# Altium footprint library ST封装.PcbLib: 1336 footprints (part 79 of 109)
Each footprint in its own frame and in the unit in brackets; x right, y up, seen from the top. Pads: shape width x height; smd on the part's side, far side on the other; paste and mask are expansions set on the pad; w line width, h text height; cw(c..) or ccw(c..) is an arc to the next point about the centre after c.
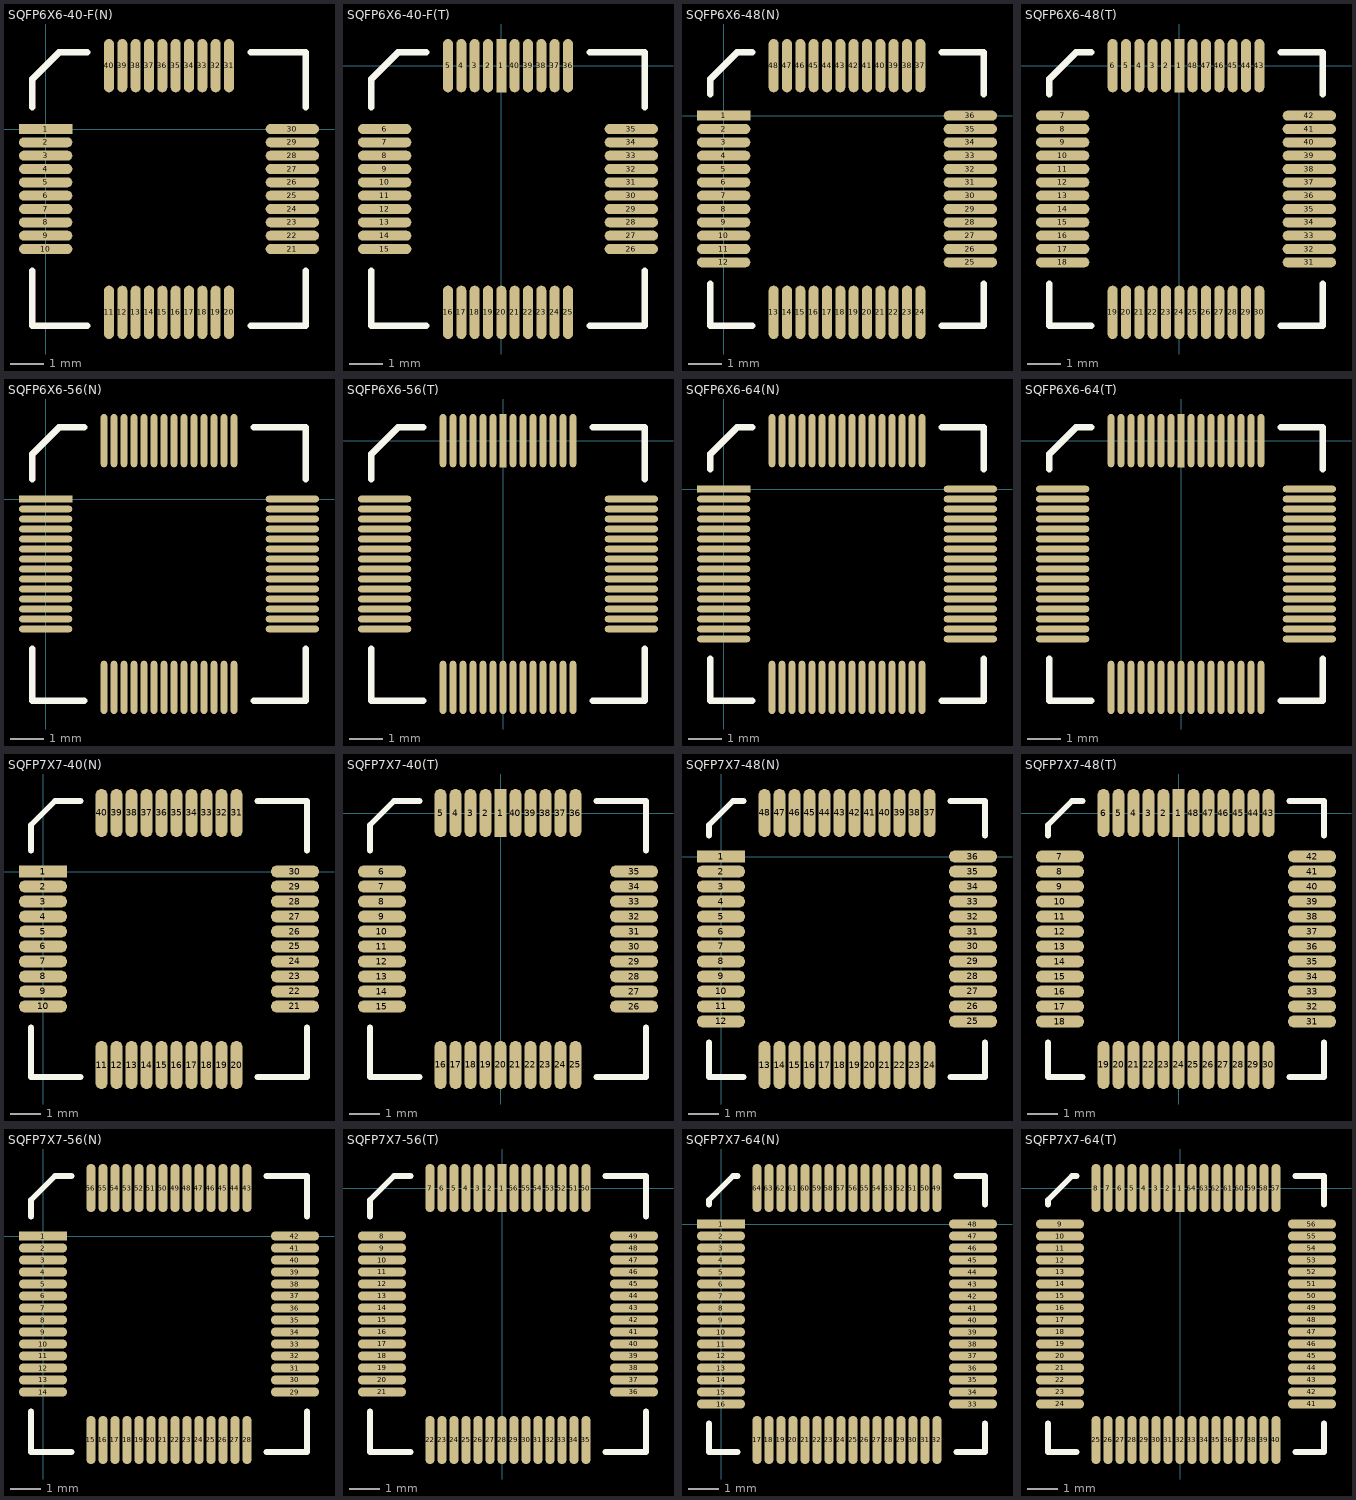
[diagram p78: the footprints below, top view; thin cyan lines are the x and y axes]

## SQFP6X6-40-F(N) [mm]
pads (40):
  rect 1.6x0.3 smd: 1(0,0)
  oval 1.6x0.3 smd: 2(0,-0.4) 3(0,-0.8) 4(0,-1.2) 5(0,-1.6) 6(0,-2) 7(0,-2.4) 8(0,-2.8) 9(0,-3.2) 10(0,-3.6) 21(7.4,-3.6) 22(7.4,-3.2) 23(7.4,-2.8) 24(7.4,-2.4) 25(7.4,-2) 26(7.4,-1.6) 27(7.4,-1.2) 28(7.4,-0.8) 29(7.4,-0.4) 30(7.4,0)
  oval 0.3x1.6 smd: 11(1.9,-5.5) 12(2.3,-5.5) 13(2.7,-5.5) 14(3.1,-5.5) 15(3.5,-5.5) 16(3.9,-5.5) 17(4.3,-5.5) 18(4.7,-5.5) 19(5.1,-5.5) 20(5.5,-5.5) 31(5.5,1.9) 32(5.1,1.9) 33(4.7,1.9) 34(4.3,1.9) 35(3.9,1.9) 36(3.5,1.9) 37(3.1,1.9) 38(2.7,1.9) 39(2.3,1.9) 40(1.9,1.9)
Top Overlay:
  lines w0.2: -0.4,-4.25 -0.4,-5.9 1.25,-5.9 ; -0.4,0.65 -0.4,1.5 0.4,2.3 1.25,2.3 ; 6.15,-5.9 7.8,-5.9 7.8,-4.25 ; 6.15,2.3 7.8,2.3 7.8,0.65

## SQFP6X6-40-F(T) [mm]
pads (40):
  rect 0.3x1.6 smd: 1(0,0)
  oval 0.3x1.6 smd: 2(-0.4,0) 3(-0.8,0) 4(-1.2,0) 5(-1.6,0) 16(-1.6,-7.4) 17(-1.2,-7.4) 18(-0.8,-7.4) 19(-0.4,-7.4) 20(0,-7.4) 21(0.4,-7.4) 22(0.8,-7.4) 23(1.2,-7.4) 24(1.6,-7.4) 25(2,-7.4) 36(2,0) 37(1.6,0) 38(1.2,0) 39(0.8,0) 40(0.4,0)
  oval 1.6x0.3 smd: 6(-3.5,-1.9) 7(-3.5,-2.3) 8(-3.5,-2.7) 9(-3.5,-3.1) 10(-3.5,-3.5) 11(-3.5,-3.9) 12(-3.5,-4.3) 13(-3.5,-4.7) 14(-3.5,-5.1) 15(-3.5,-5.5) 26(3.9,-5.5) 27(3.9,-5.1) 28(3.9,-4.7) 29(3.9,-4.3) 30(3.9,-3.9) 31(3.9,-3.5) 32(3.9,-3.1) 33(3.9,-2.7) 34(3.9,-2.3) 35(3.9,-1.9)
Top Overlay:
  lines w0.2: -3.9,-6.15 -3.9,-7.8 -2.25,-7.8 ; -3.9,-1.25 -3.9,-0.4 -3.1,0.4 -2.25,0.4 ; 2.65,-7.8 4.3,-7.8 4.3,-6.15 ; 2.65,0.4 4.3,0.4 4.3,-1.25

## SQFP6X6-48(N) [mm]
pads (48):
  rect 1.6x0.3 smd: 1(0,0)
  oval 1.6x0.3 smd: 2(0,-0.4) 3(0,-0.8) 4(0,-1.2) 5(0,-1.6) 6(0,-2) 7(0,-2.4) 8(0,-2.8) 9(0,-3.2) 10(0,-3.6) 11(0,-4) 12(0,-4.4) 25(7.4,-4.4) 26(7.4,-4) 27(7.4,-3.6) 28(7.4,-3.2) 29(7.4,-2.8) 30(7.4,-2.4) 31(7.4,-2) 32(7.4,-1.6) 33(7.4,-1.2) 34(7.4,-0.8) 35(7.4,-0.4) 36(7.4,0)
  oval 0.3x1.6 smd: 13(1.5,-5.9) 14(1.9,-5.9) 15(2.3,-5.9) 16(2.7,-5.9) 17(3.1,-5.9) 18(3.5,-5.9) 19(3.9,-5.9) 20(4.3,-5.9) 21(4.7,-5.9) 22(5.1,-5.9) 23(5.5,-5.9) 24(5.9,-5.9) 37(5.9,1.5) 38(5.5,1.5) 39(5.1,1.5) 40(4.7,1.5) 41(4.3,1.5) 42(3.9,1.5) 43(3.5,1.5) 44(3.1,1.5) 45(2.7,1.5) 46(2.3,1.5) 47(1.9,1.5) 48(1.5,1.5)
Top Overlay:
  lines w0.2: -0.4,-5.05 -0.4,-6.3 0.85,-6.3 ; -0.4,0.65 -0.4,1.1 0.4,1.9 0.85,1.9 ; 6.55,-6.3 7.8,-6.3 7.8,-5.05 ; 6.55,1.9 7.8,1.9 7.8,0.65

## SQFP6X6-48(T) [mm]
pads (48):
  rect 0.3x1.6 smd: 1(0,0)
  oval 0.3x1.6 smd: 2(-0.4,0) 3(-0.8,0) 4(-1.2,0) 5(-1.6,0) 6(-2,0) 19(-2,-7.4) 20(-1.6,-7.4) 21(-1.2,-7.4) 22(-0.8,-7.4) 23(-0.4,-7.4) 24(0,-7.4) 25(0.4,-7.4) 26(0.8,-7.4) 27(1.2,-7.4) 28(1.6,-7.4) 29(2,-7.4) 30(2.4,-7.4) 43(2.4,0) 44(2,0) 45(1.6,0) 46(1.2,0) 47(0.8,0) 48(0.4,0)
  oval 1.6x0.3 smd: 7(-3.5,-1.5) 8(-3.5,-1.9) 9(-3.5,-2.3) 10(-3.5,-2.7) 11(-3.5,-3.1) 12(-3.5,-3.5) 13(-3.5,-3.9) 14(-3.5,-4.3) 15(-3.5,-4.7) 16(-3.5,-5.1) 17(-3.5,-5.5) 18(-3.5,-5.9) 31(3.9,-5.9) 32(3.9,-5.5) 33(3.9,-5.1) 34(3.9,-4.7) 35(3.9,-4.3) 36(3.9,-3.9) 37(3.9,-3.5) 38(3.9,-3.1) 39(3.9,-2.7) 40(3.9,-2.3) 41(3.9,-1.9) 42(3.9,-1.5)
Top Overlay:
  lines w0.2: -3.9,-6.55 -3.9,-7.8 -2.65,-7.8 ; -3.9,-0.85 -3.9,-0.4 -3.1,0.4 -2.65,0.4 ; 3.05,-7.8 4.3,-7.8 4.3,-6.55 ; 3.05,0.4 4.3,0.4 4.3,-0.85

## SQFP6X6-56(N) [mm]
pads (56):
  rect 1.6x0.2 smd: 1(0,0)
  oval 1.6x0.2 smd: 2(0,-0.3) 3(0,-0.6) 4(0,-0.9) 5(0,-1.2) 6(0,-1.5) 7(0,-1.8) 8(0,-2.1) 9(0,-2.4) 10(0,-2.7) 11(0,-3) 12(0,-3.3) 13(0,-3.6) 14(0,-3.9) 29(7.4,-3.9) 30(7.4,-3.6) 31(7.4,-3.3) 32(7.4,-3) 33(7.4,-2.7) 34(7.4,-2.4) 35(7.4,-2.1) 36(7.4,-1.8) 37(7.4,-1.5) 38(7.4,-1.2) 39(7.4,-0.9) 40(7.4,-0.6) 41(7.4,-0.3) 42(7.4,0)
  oval 0.2x1.6 smd: 15(1.75,-5.65) 16(2.05,-5.65) 17(2.35,-5.65) 18(2.65,-5.65) 19(2.95,-5.65) 20(3.25,-5.65) 21(3.55,-5.65) 22(3.85,-5.65) 23(4.15,-5.65) 24(4.45,-5.65) 25(4.75,-5.65) 26(5.05,-5.65) 27(5.35,-5.65) 28(5.65,-5.65) 43(5.65,1.75) 44(5.35,1.75) 45(5.05,1.75) 46(4.75,1.75) 47(4.45,1.75) 48(4.15,1.75) 49(3.85,1.75) 50(3.55,1.75) 51(3.25,1.75) 52(2.95,1.75) 53(2.65,1.75) 54(2.35,1.75) 55(2.05,1.75) 56(1.75,1.75)
Top Overlay:
  lines w0.2: -0.4,-4.5 -0.4,-6.05 1.15,-6.05 ; -0.4,0.6 -0.4,1.35 0.4,2.15 1.15,2.15 ; 6.25,-6.05 7.8,-6.05 7.8,-4.5 ; 6.25,2.15 7.8,2.15 7.8,0.6

## SQFP6X6-56(T) [mm]
pads (56):
  rect 0.2x1.6 smd: 1(0,0)
  oval 0.2x1.6 smd: 2(-0.3,0) 3(-0.6,0) 4(-0.9,0) 5(-1.2,0) 6(-1.5,0) 7(-1.8,0) 22(-1.8,-7.4) 23(-1.5,-7.4) 24(-1.2,-7.4) 25(-0.9,-7.4) 26(-0.6,-7.4) 27(-0.3,-7.4) 28(0,-7.4) 29(0.3,-7.4) 30(0.6,-7.4) 31(0.9,-7.4) 32(1.2,-7.4) 33(1.5,-7.4) 34(1.8,-7.4) 35(2.1,-7.4) 50(2.1,0) 51(1.8,0) 52(1.5,0) 53(1.2,0) 54(0.9,0) 55(0.6,0) 56(0.3,0)
  oval 1.6x0.2 smd: 8(-3.55,-1.75) 9(-3.55,-2.05) 10(-3.55,-2.35) 11(-3.55,-2.65) 12(-3.55,-2.95) 13(-3.55,-3.25) 14(-3.55,-3.55) 15(-3.55,-3.85) 16(-3.55,-4.15) 17(-3.55,-4.45) 18(-3.55,-4.75) 19(-3.55,-5.05) 20(-3.55,-5.35) 21(-3.55,-5.65) 36(3.85,-5.65) 37(3.85,-5.35) 38(3.85,-5.05) 39(3.85,-4.75) 40(3.85,-4.45) 41(3.85,-4.15) 42(3.85,-3.85) 43(3.85,-3.55) 44(3.85,-3.25) 45(3.85,-2.95) 46(3.85,-2.65) 47(3.85,-2.35) 48(3.85,-2.05) 49(3.85,-1.75)
Top Overlay:
  lines w0.2: -3.95,-6.25 -3.95,-7.8 -2.4,-7.8 ; -3.95,-1.15 -3.95,-0.4 -3.15,0.4 -2.4,0.4 ; 2.7,-7.8 4.25,-7.8 4.25,-6.25 ; 2.7,0.4 4.25,0.4 4.25,-1.15

## SQFP6X6-64(N) [mm]
pads (64):
  rect 1.6x0.2 smd: 1(0,0)
  oval 1.6x0.2 smd: 2(0,-0.3) 3(0,-0.6) 4(0,-0.9) 5(0,-1.2) 6(0,-1.5) 7(0,-1.8) 8(0,-2.1) 9(0,-2.4) 10(0,-2.7) 11(0,-3) 12(0,-3.3) 13(0,-3.6) 14(0,-3.9) 15(0,-4.2) 16(0,-4.5) 33(7.4,-4.5) 34(7.4,-4.2) 35(7.4,-3.9) 36(7.4,-3.6) 37(7.4,-3.3) 38(7.4,-3) 39(7.4,-2.7) 40(7.4,-2.4) 41(7.4,-2.1) 42(7.4,-1.8) 43(7.4,-1.5) 44(7.4,-1.2) 45(7.4,-0.9) 46(7.4,-0.6) 47(7.4,-0.3) 48(7.4,0)
  oval 0.2x1.6 smd: 17(1.45,-5.95) 18(1.75,-5.95) 19(2.05,-5.95) 20(2.35,-5.95) 21(2.65,-5.95) 22(2.95,-5.95) 23(3.25,-5.95) 24(3.55,-5.95) 25(3.85,-5.95) 26(4.15,-5.95) 27(4.45,-5.95) 28(4.75,-5.95) 29(5.05,-5.95) 30(5.35,-5.95) 31(5.65,-5.95) 32(5.95,-5.95) 49(5.95,1.45) 50(5.65,1.45) 51(5.35,1.45) 52(5.05,1.45) 53(4.75,1.45) 54(4.45,1.45) 55(4.15,1.45) 56(3.85,1.45) 57(3.55,1.45) 58(3.25,1.45) 59(2.95,1.45) 60(2.65,1.45) 61(2.35,1.45) 62(2.05,1.45) 63(1.75,1.45) 64(1.45,1.45)
Top Overlay:
  lines w0.2: -0.4,-5.1 -0.4,-6.35 0.85,-6.35 ; -0.4,0.6 -0.4,1.05 0.4,1.85 0.85,1.85 ; 6.55,-6.35 7.8,-6.35 7.8,-5.1 ; 6.55,1.85 7.8,1.85 7.8,0.6

## SQFP6X6-64(T) [mm]
pads (64):
  rect 0.2x1.6 smd: 1(0,0)
  oval 0.2x1.6 smd: 2(-0.3,0) 3(-0.6,0) 4(-0.9,0) 5(-1.2,0) 6(-1.5,0) 7(-1.8,0) 8(-2.1,0) 25(-2.1,-7.4) 26(-1.8,-7.4) 27(-1.5,-7.4) 28(-1.2,-7.4) 29(-0.9,-7.4) 30(-0.6,-7.4) 31(-0.3,-7.4) 32(0,-7.4) 33(0.3,-7.4) 34(0.6,-7.4) 35(0.9,-7.4) 36(1.2,-7.4) 37(1.5,-7.4) 38(1.8,-7.4) 39(2.1,-7.4) 40(2.4,-7.4) 57(2.4,0) 58(2.1,0) 59(1.8,0) 60(1.5,0) 61(1.2,0) 62(0.9,0) 63(0.6,0) 64(0.3,0)
  oval 1.6x0.2 smd: 9(-3.55,-1.45) 10(-3.55,-1.75) 11(-3.55,-2.05) 12(-3.55,-2.35) 13(-3.55,-2.65) 14(-3.55,-2.95) 15(-3.55,-3.25) 16(-3.55,-3.55) 17(-3.55,-3.85) 18(-3.55,-4.15) 19(-3.55,-4.45) 20(-3.55,-4.75) 21(-3.55,-5.05) 22(-3.55,-5.35) 23(-3.55,-5.65) 24(-3.55,-5.95) 41(3.85,-5.95) 42(3.85,-5.65) 43(3.85,-5.35) 44(3.85,-5.05) 45(3.85,-4.75) 46(3.85,-4.45) 47(3.85,-4.15) 48(3.85,-3.85) 49(3.85,-3.55) 50(3.85,-3.25) 51(3.85,-2.95) 52(3.85,-2.65) 53(3.85,-2.35) 54(3.85,-2.05) 55(3.85,-1.75) 56(3.85,-1.45)
Top Overlay:
  lines w0.2: -3.95,-6.55 -3.95,-7.8 -2.7,-7.8 ; -3.95,-0.85 -3.95,-0.4 -3.15,0.4 -2.7,0.4 ; 3,-7.8 4.25,-7.8 4.25,-6.55 ; 3,0.4 4.25,0.4 4.25,-0.85

## SQFP7X7-40(N) [mm]
pads (40):
  rect 1.6x0.4 smd: 1(0,0)
  oval 1.6x0.4 smd: 2(0,-0.5) 3(0,-1) 4(0,-1.5) 5(0,-2) 6(0,-2.5) 7(0,-3) 8(0,-3.5) 9(0,-4) 10(0,-4.5) 21(8.4,-4.5) 22(8.4,-4) 23(8.4,-3.5) 24(8.4,-3) 25(8.4,-2.5) 26(8.4,-2) 27(8.4,-1.5) 28(8.4,-1) 29(8.4,-0.5) 30(8.4,0)
  oval 0.4x1.6 smd: 11(1.95,-6.45) 12(2.45,-6.45) 13(2.95,-6.45) 14(3.45,-6.45) 15(3.95,-6.45) 16(4.45,-6.45) 17(4.95,-6.45) 18(5.45,-6.45) 19(5.95,-6.45) 20(6.45,-6.45) 31(6.45,1.95) 32(5.95,1.95) 33(5.45,1.95) 34(4.95,1.95) 35(4.45,1.95) 36(3.95,1.95) 37(3.45,1.95) 38(2.95,1.95) 39(2.45,1.95) 40(1.95,1.95)
Top Overlay:
  lines w0.2: -0.4,-5.2 -0.4,-6.85 1.25,-6.85 ; -0.4,0.7 -0.4,1.55 0.4,2.35 1.25,2.35 ; 7.15,-6.85 8.8,-6.85 8.8,-5.2 ; 7.15,2.35 8.8,2.35 8.8,0.7

## SQFP7X7-40(T) [mm]
pads (40):
  rect 0.4x1.6 smd: 1(0,0)
  oval 0.4x1.6 smd: 2(-0.5,0) 3(-1,0) 4(-1.5,0) 5(-2,0) 16(-2,-8.4) 17(-1.5,-8.4) 18(-1,-8.4) 19(-0.5,-8.4) 20(0,-8.4) 21(0.5,-8.4) 22(1,-8.4) 23(1.5,-8.4) 24(2,-8.4) 25(2.5,-8.4) 36(2.5,0) 37(2,0) 38(1.5,0) 39(1,0) 40(0.5,0)
  oval 1.6x0.4 smd: 6(-3.95,-1.95) 7(-3.95,-2.45) 8(-3.95,-2.95) 9(-3.95,-3.45) 10(-3.95,-3.95) 11(-3.95,-4.45) 12(-3.95,-4.95) 13(-3.95,-5.45) 14(-3.95,-5.95) 15(-3.95,-6.45) 26(4.45,-6.45) 27(4.45,-5.95) 28(4.45,-5.45) 29(4.45,-4.95) 30(4.45,-4.45) 31(4.45,-3.95) 32(4.45,-3.45) 33(4.45,-2.95) 34(4.45,-2.45) 35(4.45,-1.95)
Top Overlay:
  lines w0.2: -4.35,-7.15 -4.35,-8.8 -2.7,-8.8 ; -4.35,-1.25 -4.35,-0.4 -3.55,0.4 -2.7,0.4 ; 3.2,-8.8 4.85,-8.8 4.85,-7.15 ; 3.2,0.4 4.85,0.4 4.85,-1.25

## SQFP7X7-48(N) [mm]
pads (48):
  rect 1.6x0.4 smd: 1(0,0)
  oval 1.6x0.4 smd: 2(0,-0.5) 3(0,-1) 4(0,-1.5) 5(0,-2) 6(0,-2.5) 7(0,-3) 8(0,-3.5) 9(0,-4) 10(0,-4.5) 11(0,-5) 12(0,-5.5) 25(8.4,-5.5) 26(8.4,-5) 27(8.4,-4.5) 28(8.4,-4) 29(8.4,-3.5) 30(8.4,-3) 31(8.4,-2.5) 32(8.4,-2) 33(8.4,-1.5) 34(8.4,-1) 35(8.4,-0.5) 36(8.4,0)
  oval 0.4x1.6 smd: 13(1.45,-6.95) 14(1.95,-6.95) 15(2.45,-6.95) 16(2.95,-6.95) 17(3.45,-6.95) 18(3.95,-6.95) 19(4.45,-6.95) 20(4.95,-6.95) 21(5.45,-6.95) 22(5.95,-6.95) 23(6.45,-6.95) 24(6.95,-6.95) 37(6.95,1.45) 38(6.45,1.45) 39(5.95,1.45) 40(5.45,1.45) 41(4.95,1.45) 42(4.45,1.45) 43(3.95,1.45) 44(3.45,1.45) 45(2.95,1.45) 46(2.45,1.45) 47(1.95,1.45) 48(1.45,1.45)
Top Overlay:
  lines w0.2: -0.4,-6.2 -0.4,-7.35 0.75,-7.35 ; -0.4,0.7 -0.4,1.05 0.4,1.85 0.75,1.85 ; 7.65,-7.35 8.8,-7.35 8.8,-6.2 ; 7.65,1.85 8.8,1.85 8.8,0.7

## SQFP7X7-48(T) [mm]
pads (48):
  rect 0.4x1.6 smd: 1(0,0)
  oval 0.4x1.6 smd: 2(-0.5,0) 3(-1,0) 4(-1.5,0) 5(-2,0) 6(-2.5,0) 19(-2.5,-8.4) 20(-2,-8.4) 21(-1.5,-8.4) 22(-1,-8.4) 23(-0.5,-8.4) 24(0,-8.4) 25(0.5,-8.4) 26(1,-8.4) 27(1.5,-8.4) 28(2,-8.4) 29(2.5,-8.4) 30(3,-8.4) 43(3,0) 44(2.5,0) 45(2,0) 46(1.5,0) 47(1,0) 48(0.5,0)
  oval 1.6x0.4 smd: 7(-3.95,-1.45) 8(-3.95,-1.95) 9(-3.95,-2.45) 10(-3.95,-2.95) 11(-3.95,-3.45) 12(-3.95,-3.95) 13(-3.95,-4.45) 14(-3.95,-4.95) 15(-3.95,-5.45) 16(-3.95,-5.95) 17(-3.95,-6.45) 18(-3.95,-6.95) 31(4.45,-6.95) 32(4.45,-6.45) 33(4.45,-5.95) 34(4.45,-5.45) 35(4.45,-4.95) 36(4.45,-4.45) 37(4.45,-3.95) 38(4.45,-3.45) 39(4.45,-2.95) 40(4.45,-2.45) 41(4.45,-1.95) 42(4.45,-1.45)
Top Overlay:
  lines w0.2: -4.35,-7.65 -4.35,-8.8 -3.2,-8.8 ; -4.35,-0.75 -4.35,-0.4 -3.55,0.4 -3.2,0.4 ; 3.7,-8.8 4.85,-8.8 4.85,-7.65 ; 3.7,0.4 4.85,0.4 4.85,-0.75

## SQFP7X7-56(N) [mm]
pads (56):
  rect 1.6x0.3 smd: 1(0,0)
  oval 1.6x0.3 smd: 2(0,-0.4) 3(0,-0.8) 4(0,-1.2) 5(0,-1.6) 6(0,-2) 7(0,-2.4) 8(0,-2.8) 9(0,-3.2) 10(0,-3.6) 11(0,-4) 12(0,-4.4) 13(0,-4.8) 14(0,-5.2) 29(8.4,-5.2) 30(8.4,-4.8) 31(8.4,-4.4) 32(8.4,-4) 33(8.4,-3.6) 34(8.4,-3.2) 35(8.4,-2.8) 36(8.4,-2.4) 37(8.4,-2) 38(8.4,-1.6) 39(8.4,-1.2) 40(8.4,-0.8) 41(8.4,-0.4) 42(8.4,0)
  oval 0.3x1.6 smd: 15(1.6,-6.8) 16(2,-6.8) 17(2.4,-6.8) 18(2.8,-6.8) 19(3.2,-6.8) 20(3.6,-6.8) 21(4,-6.8) 22(4.4,-6.8) 23(4.8,-6.8) 24(5.2,-6.8) 25(5.6,-6.8) 26(6,-6.8) 27(6.4,-6.8) 28(6.8,-6.8) 43(6.8,1.6) 44(6.4,1.6) 45(6,1.6) 46(5.6,1.6) 47(5.2,1.6) 48(4.8,1.6) 49(4.4,1.6) 50(4,1.6) 51(3.6,1.6) 52(3.2,1.6) 53(2.8,1.6) 54(2.4,1.6) 55(2,1.6) 56(1.6,1.6)
Top Overlay:
  lines w0.2: -0.4,-5.85 -0.4,-7.2 0.95,-7.2 ; -0.4,0.65 -0.4,1.2 0.4,2 0.95,2 ; 7.45,-7.2 8.8,-7.2 8.8,-5.85 ; 7.45,2 8.8,2 8.8,0.65

## SQFP7X7-56(T) [mm]
pads (56):
  rect 0.3x1.6 smd: 1(0,0)
  oval 0.3x1.6 smd: 2(-0.4,0) 3(-0.8,0) 4(-1.2,0) 5(-1.6,0) 6(-2,0) 7(-2.4,0) 22(-2.4,-8.4) 23(-2,-8.4) 24(-1.6,-8.4) 25(-1.2,-8.4) 26(-0.8,-8.4) 27(-0.4,-8.4) 28(0,-8.4) 29(0.4,-8.4) 30(0.8,-8.4) 31(1.2,-8.4) 32(1.6,-8.4) 33(2,-8.4) 34(2.4,-8.4) 35(2.8,-8.4) 50(2.8,0) 51(2.4,0) 52(2,0) 53(1.6,0) 54(1.2,0) 55(0.8,0) 56(0.4,0)
  oval 1.6x0.3 smd: 8(-4,-1.6) 9(-4,-2) 10(-4,-2.4) 11(-4,-2.8) 12(-4,-3.2) 13(-4,-3.6) 14(-4,-4) 15(-4,-4.4) 16(-4,-4.8) 17(-4,-5.2) 18(-4,-5.6) 19(-4,-6) 20(-4,-6.4) 21(-4,-6.8) 36(4.4,-6.8) 37(4.4,-6.4) 38(4.4,-6) 39(4.4,-5.6) 40(4.4,-5.2) 41(4.4,-4.8) 42(4.4,-4.4) 43(4.4,-4) 44(4.4,-3.6) 45(4.4,-3.2) 46(4.4,-2.8) 47(4.4,-2.4) 48(4.4,-2) 49(4.4,-1.6)
Top Overlay:
  lines w0.2: -4.4,-7.45 -4.4,-8.8 -3.05,-8.8 ; -4.4,-0.95 -4.4,-0.4 -3.6,0.4 -3.05,0.4 ; 3.45,-8.8 4.8,-8.8 4.8,-7.45 ; 3.45,0.4 4.8,0.4 4.8,-0.95

## SQFP7X7-64(N) [mm]
pads (64):
  rect 1.6x0.3 smd: 1(0,0)
  oval 1.6x0.3 smd: 2(0,-0.4) 3(0,-0.8) 4(0,-1.2) 5(0,-1.6) 6(0,-2) 7(0,-2.4) 8(0,-2.8) 9(0,-3.2) 10(0,-3.6) 11(0,-4) 12(0,-4.4) 13(0,-4.8) 14(0,-5.2) 15(0,-5.6) 16(0,-6) 33(8.4,-6) 34(8.4,-5.6) 35(8.4,-5.2) 36(8.4,-4.8) 37(8.4,-4.4) 38(8.4,-4) 39(8.4,-3.6) 40(8.4,-3.2) 41(8.4,-2.8) 42(8.4,-2.4) 43(8.4,-2) 44(8.4,-1.6) 45(8.4,-1.2) 46(8.4,-0.8) 47(8.4,-0.4) 48(8.4,0)
  oval 0.3x1.6 smd: 17(1.2,-7.2) 18(1.6,-7.2) 19(2,-7.2) 20(2.4,-7.2) 21(2.8,-7.2) 22(3.2,-7.2) 23(3.6,-7.2) 24(4,-7.2) 25(4.4,-7.2) 26(4.8,-7.2) 27(5.2,-7.2) 28(5.6,-7.2) 29(6,-7.2) 30(6.4,-7.2) 31(6.8,-7.2) 32(7.2,-7.2) 49(7.2,1.2) 50(6.8,1.2) 51(6.4,1.2) 52(6,1.2) 53(5.6,1.2) 54(5.2,1.2) 55(4.8,1.2) 56(4.4,1.2) 57(4,1.2) 58(3.6,1.2) 59(3.2,1.2) 60(2.8,1.2) 61(2.4,1.2) 62(2,1.2) 63(1.6,1.2) 64(1.2,1.2)
Top Overlay:
  lines w0.2: -0.4,-6.65 -0.4,-7.6 0.55,-7.6 ; -0.4,0.65 -0.4,0.8 0.4,1.6 0.55,1.6 ; 7.85,-7.6 8.8,-7.6 8.8,-6.65 ; 7.85,1.6 8.8,1.6 8.8,0.65

## SQFP7X7-64(T) [mm]
pads (64):
  rect 0.3x1.6 smd: 1(0,0)
  oval 0.3x1.6 smd: 2(-0.4,0) 3(-0.8,0) 4(-1.2,0) 5(-1.6,0) 6(-2,0) 7(-2.4,0) 8(-2.8,0) 25(-2.8,-8.4) 26(-2.4,-8.4) 27(-2,-8.4) 28(-1.6,-8.4) 29(-1.2,-8.4) 30(-0.8,-8.4) 31(-0.4,-8.4) 32(0,-8.4) 33(0.4,-8.4) 34(0.8,-8.4) 35(1.2,-8.4) 36(1.6,-8.4) 37(2,-8.4) 38(2.4,-8.4) 39(2.8,-8.4) 40(3.2,-8.4) 57(3.2,0) 58(2.8,0) 59(2.4,0) 60(2,0) 61(1.6,0) 62(1.2,0) 63(0.8,0) 64(0.4,0)
  oval 1.6x0.3 smd: 9(-4,-1.2) 10(-4,-1.6) 11(-4,-2) 12(-4,-2.4) 13(-4,-2.8) 14(-4,-3.2) 15(-4,-3.6) 16(-4,-4) 17(-4,-4.4) 18(-4,-4.8) 19(-4,-5.2) 20(-4,-5.6) 21(-4,-6) 22(-4,-6.4) 23(-4,-6.8) 24(-4,-7.2) 41(4.4,-7.2) 42(4.4,-6.8) 43(4.4,-6.4) 44(4.4,-6) 45(4.4,-5.6) 46(4.4,-5.2) 47(4.4,-4.8) 48(4.4,-4.4) 49(4.4,-4) 50(4.4,-3.6) 51(4.4,-3.2) 52(4.4,-2.8) 53(4.4,-2.4) 54(4.4,-2) 55(4.4,-1.6) 56(4.4,-1.2)
Top Overlay:
  lines w0.2: -4.4,-7.85 -4.4,-8.8 -3.45,-8.8 ; -4.4,-0.55 -4.4,-0.4 -3.6,0.4 -3.45,0.4 ; 3.85,-8.8 4.8,-8.8 4.8,-7.85 ; 3.85,0.4 4.8,0.4 4.8,-0.55